# Altium footprint library Elettronica FM.PcbLib: 387 footprints (part 20 of 25)
Each footprint in its own frame and in the unit in brackets; x right, y up, seen from the top. Pads: shape width x height; smd on the part's side, far side on the other; paste and mask are expansions set on the pad; w line width, h text height; cw(c..) or ccw(c..) is an arc to the next point about the centre after c.
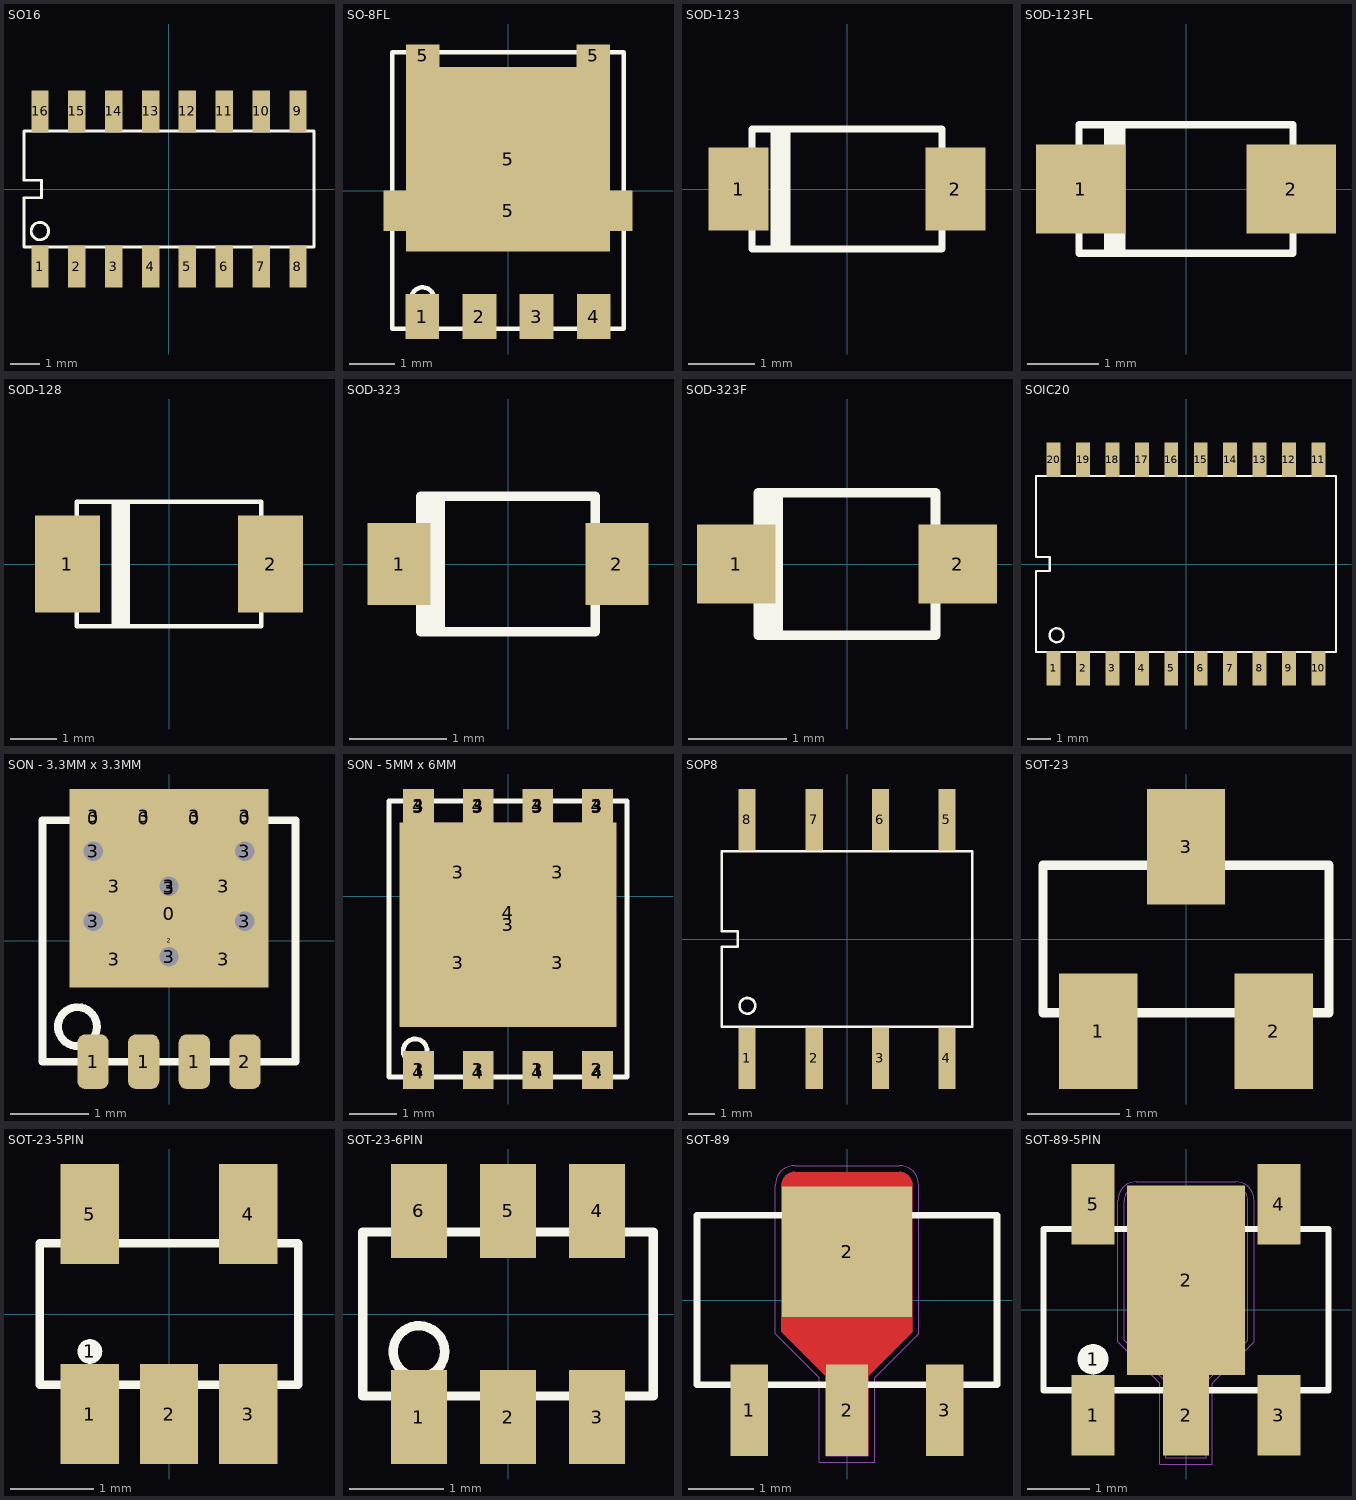
[diagram p19: the footprints below, top view; thin cyan lines are the x and y axes]

## SO16 [mm]
height 1.9
pads (16):
  rect 0.6x1.45 smd paste-0.05 mask+0.075: 1(-4.445,-2.675) 2(-3.175,-2.675) 3(-1.905,-2.675) 4(-0.635,-2.675) 5(0.635,-2.675) 6(1.905,-2.675) 7(3.175,-2.675) 8(4.445,-2.675) 9(4.445,2.675) 10(3.175,2.675) 11(1.905,2.675) 12(0.635,2.675) 13(-0.635,2.675) 14(-1.905,2.675) 15(-3.175,2.675) 16(-4.445,2.675)
Top Overlay:
  circle w0.1: c-4.45,-1.45 r0.3
  lines w0.1: -5,-2 5,-2 5,2 -5,2 -5,0.3 -4.4,0.3 -4.4,-0.3 -5,-0.3 -5,-2
3D body: height 1.8, standoff 0, extent -4.749,-1.748 -4.151,-1.15
3D body: height 1, standoff 0, extent 0.385,2 0.885,3.1
3D body: height 1.75, standoff 0, extent -5,-2 5,2
3D body: height 1, standoff 0, extent 1.655,2 2.155,3.1
3D body: height 1, standoff 0, extent 2.925,2 3.425,3.1
3D body: height 1, standoff 0, extent 4.195,2 4.695,3.1
3D body: height 1, standoff 0, extent -0.885,2 -0.385,3.1
3D body: height 1, standoff 0, extent -2.155,2 -1.655,3.1
3D body: height 1, standoff 0, extent -3.425,2 -2.925,3.1
3D body: height 1, standoff 0, extent -4.695,2 -4.195,3.1
3D body: height 1, standoff 0, extent -4.695,-3.1 -4.195,-2
3D body: height 1, standoff 0, extent -3.425,-3.1 -2.925,-2
3D body: height 1, standoff 0, extent -2.155,-3.1 -1.655,-2
3D body: height 1, standoff 0, extent -0.885,-3.1 -0.385,-2
3D body: height 1, standoff 0, extent 0.385,-3.1 0.885,-2
3D body: height 1, standoff 0, extent 1.655,-3.1 2.155,-2
3D body: height 1, standoff 0, extent 2.925,-3.1 3.425,-2
3D body: height 1, standoff 0, extent 4.195,-3.1 4.695,-2

## SO-8FL [mm]
height 1.9
pads (8):
  rect 0.75x1 smd paste-0.05 mask+0.075: 1(-1.905,-2.8) 2(-0.635,-2.8) 3(0.635,-2.8) 4(1.905,-2.8)
  rect 0.75x0.5 smd paste-0.05 mask+0.075: 5(-1.9,3) 5(1.9,3)
  rect 5.55x0.9 smd paste-0.05 mask+0.075: 5(0,-0.45)
  rect 4.55x4.1 smd paste-0.05 mask+0.075: 5(0,0.7)
Top Overlay:
  circle w0.1: c-1.9,-2.4 r0.25
  lines w0.1: -2.575,-3.075 2.575,-3.075 2.575,3.075 -2.575,3.075 -2.575,-3.075

## SOD-123 [mm]
pads (2):
  rect 0.9x1.25 smd paste-0.102: 1(-1.625,0) 2(1.625,0)
Top Overlay:
  lines w0.1: -1.425,-0.35 -1.925,-0.35 -1.925,0.35 -1.425,0.35 ; -1.1,-0.889 -1.1,0.9 ; -1,-0.878 -1,0.9 ; -0.9,-0.9 -0.9,0.9 ; 1.425,-0.35 1.925,-0.35 1.925,0.35 1.425,0.35 ; -1.425,-0.9 -1.425,0.9 1.425,0.9 1.425,-0.9 -1.425,-0.9
3D body: height 1.35, standoff 0, extent -1.425,-0.9 1.425,0.9

## SOD-123FL [mm]
pads (2):
  rect 1.25x1.25 smd paste-0.102: 1(-1.475,0) 2(1.475,0)
Top Overlay:
  lines w0.1: -1.1,-0.889 -1.1,0.9 ; -1,-0.878 -1,0.9 ; -0.9,-0.9 -0.9,0.9 ; -1.5,-0.9 -1.5,0.9 1.5,0.9 1.5,-0.9 -1.5,-0.9

## SOD-128 [mm]
pads (2):
  rect 1.4x2.1 smd paste-0.05 mask+0.075: 1(-2.2,0) 2(2.2,0)
Top Overlay:
  lines w0.1: -2,-0.95 -2.5,-0.95 -2.5,0.95 -2,0.95 ; -1.2,-1.35 -1.2,1.35 ; -1.1,-1.35 -1.1,1.35 ; -1,-1.35 -1,1.35 ; -0.9,-1.35 -0.9,1.35 ; 2,-0.95 2.5,-0.95 2.5,0.95 2,0.95 ; -2,-1.35 -2,1.35 2,1.35 2,-1.35 -2,-1.35
3D body: height 1.2, standoff 0, extent -2,-1.35 2,1.35

## SOD-323 [mm]
pads (2):
  rect 0.65x0.85 smd: 1(-1.125,0) 2(1.125,0)
Top Overlay:
  lines w0.1: -0.9,-0.2 -1.35,-0.2 -1.35,0.2 -0.9,0.2 ; -0.8,-0.7 -0.8,0.7 ; -0.7,-0.7 -0.7,0.7 ; 0.9,-0.2 1.35,-0.2 1.35,0.2 0.9,0.2 ; -0.9,-0.7 -0.9,0.7 0.9,0.7 0.9,-0.7 -0.9,-0.7
3D body: height 0.8, standoff 0, extent -0.9,-0.7 0.9,0.7

## SOD-323F [mm]
pads (2):
  rect 0.8x0.8 smd: 1(-1.125,0) 2(1.125,0)
Top Overlay:
  lines w0.1: -0.9,-0.2 -1.35,-0.2 -1.35,0.2 -0.9,0.2 ; -0.8,-0.7 -0.8,0.7 ; -0.7,-0.7 -0.7,0.7 ; 0.9,-0.2 1.35,-0.2 1.35,0.2 0.9,0.2 ; -0.9,-0.725 -0.9,0.725 0.9,0.725 0.9,-0.725 -0.9,-0.725
3D body: height 1, standoff 0, extent -0.9,-0.725 0.9,0.725

## SOIC20 [mm]
height 1.9
pads (20):
  rect 0.6x1.5 smd paste-0.102: 1(-5.715,-4.5) 2(-4.445,-4.5) 3(-3.175,-4.5) 4(-1.905,-4.5) 5(-0.635,-4.5) 6(0.635,-4.5) 7(1.905,-4.5) 8(3.175,-4.5) 9(4.445,-4.5) 10(5.715,-4.5) 11(5.715,4.5) 12(4.445,4.5) 13(3.175,4.5) 14(1.905,4.5) 15(0.635,4.5) 16(-0.635,4.5) 17(-1.905,4.5) 18(-3.175,4.5) 19(-4.445,4.5) 20(-5.715,4.5)
Top Overlay:
  circle w0.1: c-5.585,-3.075 r0.3
  lines w0.1: -6.475,-3.8 -6.475,-0.3 -5.875,-0.3 -5.875,0.3 -6.475,0.3 -6.475,3.8 6.475,3.8 6.475,-3.8 -6.475,-3.8
3D body: height 1, standoff 0, extent 2.925,3.8 3.425,4.9
3D body: height 1, standoff 0, extent 4.195,3.8 4.695,4.9
3D body: height 1, standoff 0, extent 5.465,3.8 5.965,4.9
3D body: height 1, standoff 0, extent 5.465,-4.9 5.965,-3.8
3D body: height 1, standoff 0, extent 4.195,-4.9 4.695,-3.8
3D body: height 1, standoff 0, extent 2.925,-4.9 3.425,-3.8
3D body: height 2.65, standoff 0, extent -6.41,-3.8 6.475,3.8
3D body: height 1, standoff 0, extent -4.695,3.8 -4.195,4.9
3D body: height 1, standoff 0, extent -5.965,3.8 -5.465,4.9
3D body: height 1, standoff 0, extent -3.425,3.8 -2.925,4.9
3D body: height 1, standoff 0, extent -2.155,3.8 -1.655,4.9
3D body: height 1, standoff 0, extent -2.155,-4.9 -1.655,-3.8
3D body: height 1, standoff 0, extent -3.425,-4.9 -2.925,-3.8
3D body: height 1, standoff 0, extent -4.695,-4.9 -4.195,-3.8
3D body: height 1, standoff 0, extent -5.965,-4.9 -5.465,-3.8
3D body: height 1.8, standoff 0, extent -5.885,-3.373 -5.286,-2.775
3D body: height 1, standoff 0, extent -0.885,-4.9 -0.385,-3.8
3D body: height 1, standoff 0, extent 0.385,-4.9 0.885,-3.8
3D body: height 1, standoff 0, extent 1.655,-4.9 2.155,-3.8
3D body: height 1, standoff 0, extent 1.655,3.8 2.155,4.9
3D body: height 1, standoff 0, extent 0.385,3.8 0.885,4.9
3D body: height 1, standoff 0, extent -0.885,3.8 -0.385,4.9

## SON - 3.3MM x 3.3MM [mm]
height 1.9
pads (25):
  rrect35% 0.3x0.65 on Top Solder paste-0.05 mask+0.075: 0(-0.975,1.575) 0(-0.325,1.575) 0(0.325,1.575) 0(0.975,1.575)
  rrect6% 2.45x1.8 on Top Solder paste-0.05 mask+0.075: 0(0,0.35)
  rrect50% 0.4x0.7 smd paste-0.05 mask-0.05: 1(-0.975,-1.55) 1(-0.325,-1.55) 1(0.325,-1.55) 2(0.975,-1.55)
  rect 0.1x0.1 on Top Overlay paste+0 mask+0.05: 2(0,0)
  round 0.6 hole 0.25 paste-0.05 mask-0.15: 3(-0.975,0.25) 3(-0.975,1.15) 3(0.975,0.25) 3(0.975,1.15)
  rrect35% 0.3x0.6 on Top Paste paste+0 mask+0.05: 3(-0.975,1.6) 3(-0.325,1.6) 3(0.325,1.6) 3(0.975,1.6)
  rrect13% 1.15x0.725 on Top Paste paste+0 mask+0.05: 3(-0.7,-0.238) 3(0.7,-0.238)
  rrect15% 1.15x0.65 on Top Paste paste+0 mask+0.05: 3(-0.7,0.7) 3(0.7,0.7)
  round 0.6 hole 0.25 paste-0.05 mask-0.05: 3(0,-0.2) 3(0,0.7)
  rect 2.55x2.55 smd paste-5 mask-5: 3(0,0.675)
Top Overlay:
  circle w0.1: c-1.175,-1.1 r0.25
  lines w0.1: -1.625,-1.55 -1.625,1.55 1.625,1.55 1.625,-1.55 -1.625,-1.55
Top Solder:
  region: -0.475,1.375 -0.475,1.175 -0.175,1.175 -0.175,1.375
  region: -1.125,1.375 -1.125,1.175 -0.825,1.175 -0.825,1.375
  region: 0.175,1.375 0.175,1.175 0.475,1.175 0.475,1.375
  region: 0.825,1.375 0.825,1.175 1.125,1.175 1.125,1.375
3D body: height 0.9, standoff 0, extent -1.625,-1.55 1.625,1.55

## SON - 5MM x 6MM [mm]
height 1.9
pads (30):
  rect 0.65x0.8 smd paste-5 mask+0.075: 1(-1.875,-3.65) 1(-0.625,-3.65) 1(0.625,-3.65) 2(1.875,-3.65)
  rrect10% 0.55x0.7 on Top Paste paste+0 mask+0.05: 3(-1.875,-3.65) 3(-0.625,-3.65) 3(0.625,-3.65) 3(1.875,-3.65)
  rrect10% 0.55x0.65 on Top Paste paste+0 mask+0.05: 3(-1.875,1.875) 3(-0.625,1.875) 3(0.625,1.875) 3(1.875,1.875)
  rect 0.65x0.7 smd paste-5 mask+0.075: 3(-1.875,1.9) 3(-0.625,1.9) 3(0.625,1.9) 3(1.875,1.9)
  rrect10% 1.9x1.7 on Top Paste paste+0 mask+0.05: 3(-1.05,-1.4) 3(-1.05,0.5) 3(1.05,-1.4) 3(1.05,0.5)
  rect 4.55x4.3 smd paste-5 mask+0.075: 3(0,-0.6)
  rect 0.5x0.7 on Mech27 paste+0 mask+0.05: 4(-1.875,1.9) 4(-1.875,-3.7) 4(-0.625,1.9) 4(-0.625,-3.7) 4(0.625,1.9) 4(0.625,-3.7) 4(1.875,-3.7) 4(1.875,1.9)
  rect 4x3.8 on Mech27 paste+0 mask+0.05: 4(0,-0.35)
Top Overlay:
  circle w0.1: c-1.95,-3.25 r0.25
  lines w0.1: -2.5,-3.8 2.5,-3.8 2.5,2 -2.5,2 -2.5,-3.8
3D body: height 1.1, standoff 0, extent -2.5,-3.8 2.5,2

## SOP8 [mm]
height 1.9
pads (8):
  rect 0.65x2.35 smd paste+0 mask+0.07: 1(-3.81,-4.55) 2(-1.25,-4.55) 3(1.27,-4.55) 4(3.81,-4.55) 5(3.81,4.55) 6(1.27,4.55) 7(-1.25,4.55) 8(-3.81,4.55)
Top Overlay:
  circle w0.1: c-3.8,-2.55 r0.3
  lines w0.1: -4.775,-3.35 -4.775,-0.3 -4.175,-0.3 -4.175,0.3 -4.775,0.3 -4.775,3.35 4.775,3.35 4.775,-3.35 -4.775,-3.35
3D body: height 4.85, standoff 0.4, extent -4.775,-3.35 4.775,3.35

## SOT-23 [mm]
height 1.9
pads (3):
  rect 0.85x1.25 smd paste-0.05: 1(-0.95,-1) 2(0.95,-1) 3(0,1)
Top Overlay:
  lines w0.1: -1.2,-0.8 -1.2,-1.25 -0.7,-1.25 -0.7,-0.8 ; -0.25,0.8 -0.25,1.25 0.25,1.25 0.25,0.8 ; 0.7,-0.8 0.7,-1.25 1.2,-1.25 1.2,-0.8 ; -1.55,-0.8 1.55,-0.8 1.55,0.8 -1.55,0.8 -1.55,-0.8
3D body "SOT-23.stp": height 1.1, standoff 0, extent -1.5,-1.25 1.5,1.247

## SOT-23-5PIN [mm]
height 1.9
pads (6):
  rect 0.7x1.2 smd mask+0.075: 1(-0.95,-1.2) 2(0,-1.2) 3(0.95,-1.2) 4(0.95,1.2) 5(-0.95,1.2)
  round 0.3 on Top Overlay mask+0.1: 1(-0.95,-0.45)
Top Overlay:
  lines w0.1: -1.2,-0.85 -1.2,-1.5 -0.7,-1.5 -0.7,-0.85 ; -1.2,0.85 -1.2,1.5 -0.7,1.5 -0.7,0.85 ; -0.25,-0.85 -0.25,-1.5 0.25,-1.5 0.25,-0.85 ; 0.7,-0.85 0.7,-1.5 1.2,-1.5 1.2,-0.85 ; 0.7,0.85 0.7,1.5 1.2,1.5 1.2,0.85 ; -1.55,-0.85 -1.55,0.85 1.55,0.85 1.55,-0.85 -1.55,-0.85

## SOT-23-6PIN [mm]
height 1.9
pads (6):
  rect 0.6x1 smd: 1(-0.95,-1.1) 2(0,-1.1) 3(0.95,-1.1) 4(0.95,1.1) 5(0,1.1) 6(-0.95,1.1)
Top Overlay:
  circle w0.1: c-0.95,-0.4 r0.275
  lines w0.1: -1.55,-0.875 1.55,-0.875 1.55,0.875 -1.55,0.875 -1.55,-0.875
3D body: height 1.45, standoff 0, extent -1.55,-0.875 1.55,0.875

## SOT-89 [mm]
pads (4):
  rect 0.57x1.4 smd: 1(-1.5,-1.689) 3(1.5,-1.689)
  rect 0.65x1.4 smd: 2(0,-1.689)
  rect 2x2 smd: 2(0,0.74)
Top Layer:
  region: -1,-0.489 -0.325,-1.164 0.325,-1.164 1,-0.489 1,-0.439 -1,-0.439
  region: -0.325,-1.164 -1,-0.489 -1,1.761 -1,1.8 -0.97,1.874 -0.913,1.93 -0.84,1.961 -0.8,1.961 0.8,1.961 0.84,1.961 0.913,1.93 0.97,1.874 1,1.8 1,1.761 1,-0.489 0.325,-1.164 0.325,-2.389 -0.325,-2.389
Top Overlay:
  lines w0.1: -2.3,-1.3 2.3,-1.3 2.3,1.3 -2.3,1.3 -2.3,-1.3
Top Solder:
  region: -0.425,-1.189 -1.1,-0.514 -1.1,1.761 -1.1,1.82 -1.054,1.93 -0.97,2.015 -0.86,2.061 -0.8,2.061 0.8,2.061 0.86,2.061 0.97,2.015 1.054,1.93 1.1,1.82 1.1,1.761 1.1,-0.514 0.425,-1.189 0.425,-2.489 -0.425,-2.489
Mechanical 4:
  lines w0.01: -1.1,-0.514 -0.425,-1.189 -0.425,-2.489 0.425,-2.489 0.425,-1.189 1.1,-0.514 1.1,1.761 ccw(c0.8,1.761) 0.8,2.061 -0.8,2.061 ccw(c-0.8,1.761) -1.1,1.761 -1.1,-0.514 ; -1,-0.489 -1,1.761 cw(c-0.8,1.761) -0.8,1.961 0.8,1.961 cw(c0.8,1.761) 1,1.761 1,-0.314 1,-0.489 0.325,-1.164 0.325,-2.389 -0.325,-2.389 -0.325,-1.164 -1,-0.489
3D body "SOT-89.stp": height 1.4, standoff 0, extent -2.25,-2.192 2.25,1.742

## SOT-89-5PIN [mm]
pads (7):
  rect 0.7x1.3 smd: 1(-1.5,-1.7) 3(1.5,-1.7) 4(1.5,1.7) 5(-1.5,1.7)
  round 0.5 on Top Overlay paste+0 mask+0.05: 1(-1.5,-0.8)
  rect 0.75x1.3 smd: 2(0,-1.7)
  rect 1.9x3.05 smd: 2(0,0.475)
Top Overlay:
  lines w0.1: -2.3,-1.3 2.3,-1.3 2.3,1.3 -2.3,1.3 -2.3,-1.3
Mechanical 4:
  lines w0.01: -1.1,-0.514 -0.425,-1.189 -0.425,-2.489 0.425,-2.489 0.425,-1.189 1.1,-0.514 1.1,1.761 ccw(c0.8,1.761) 0.8,2.061 -0.8,2.061 ccw(c-0.8,1.761) -1.1,1.761 -1.1,-0.514 ; -1,-0.489 -1,1.761 cw(c-0.8,1.761) -0.8,1.961 0.8,1.961 cw(c0.8,1.761) 1,1.761 1,-0.314 1,-0.489 0.325,-1.164 0.325,-2.389 -0.325,-2.389 -0.325,-1.164 -1,-0.489
3D body: height 1.6, standoff 0, extent -2.3,-1.3 2.3,1.3